# Altium schematic symbol library mastermind.SCHLIB: 732 symbols (part 5 of 5)
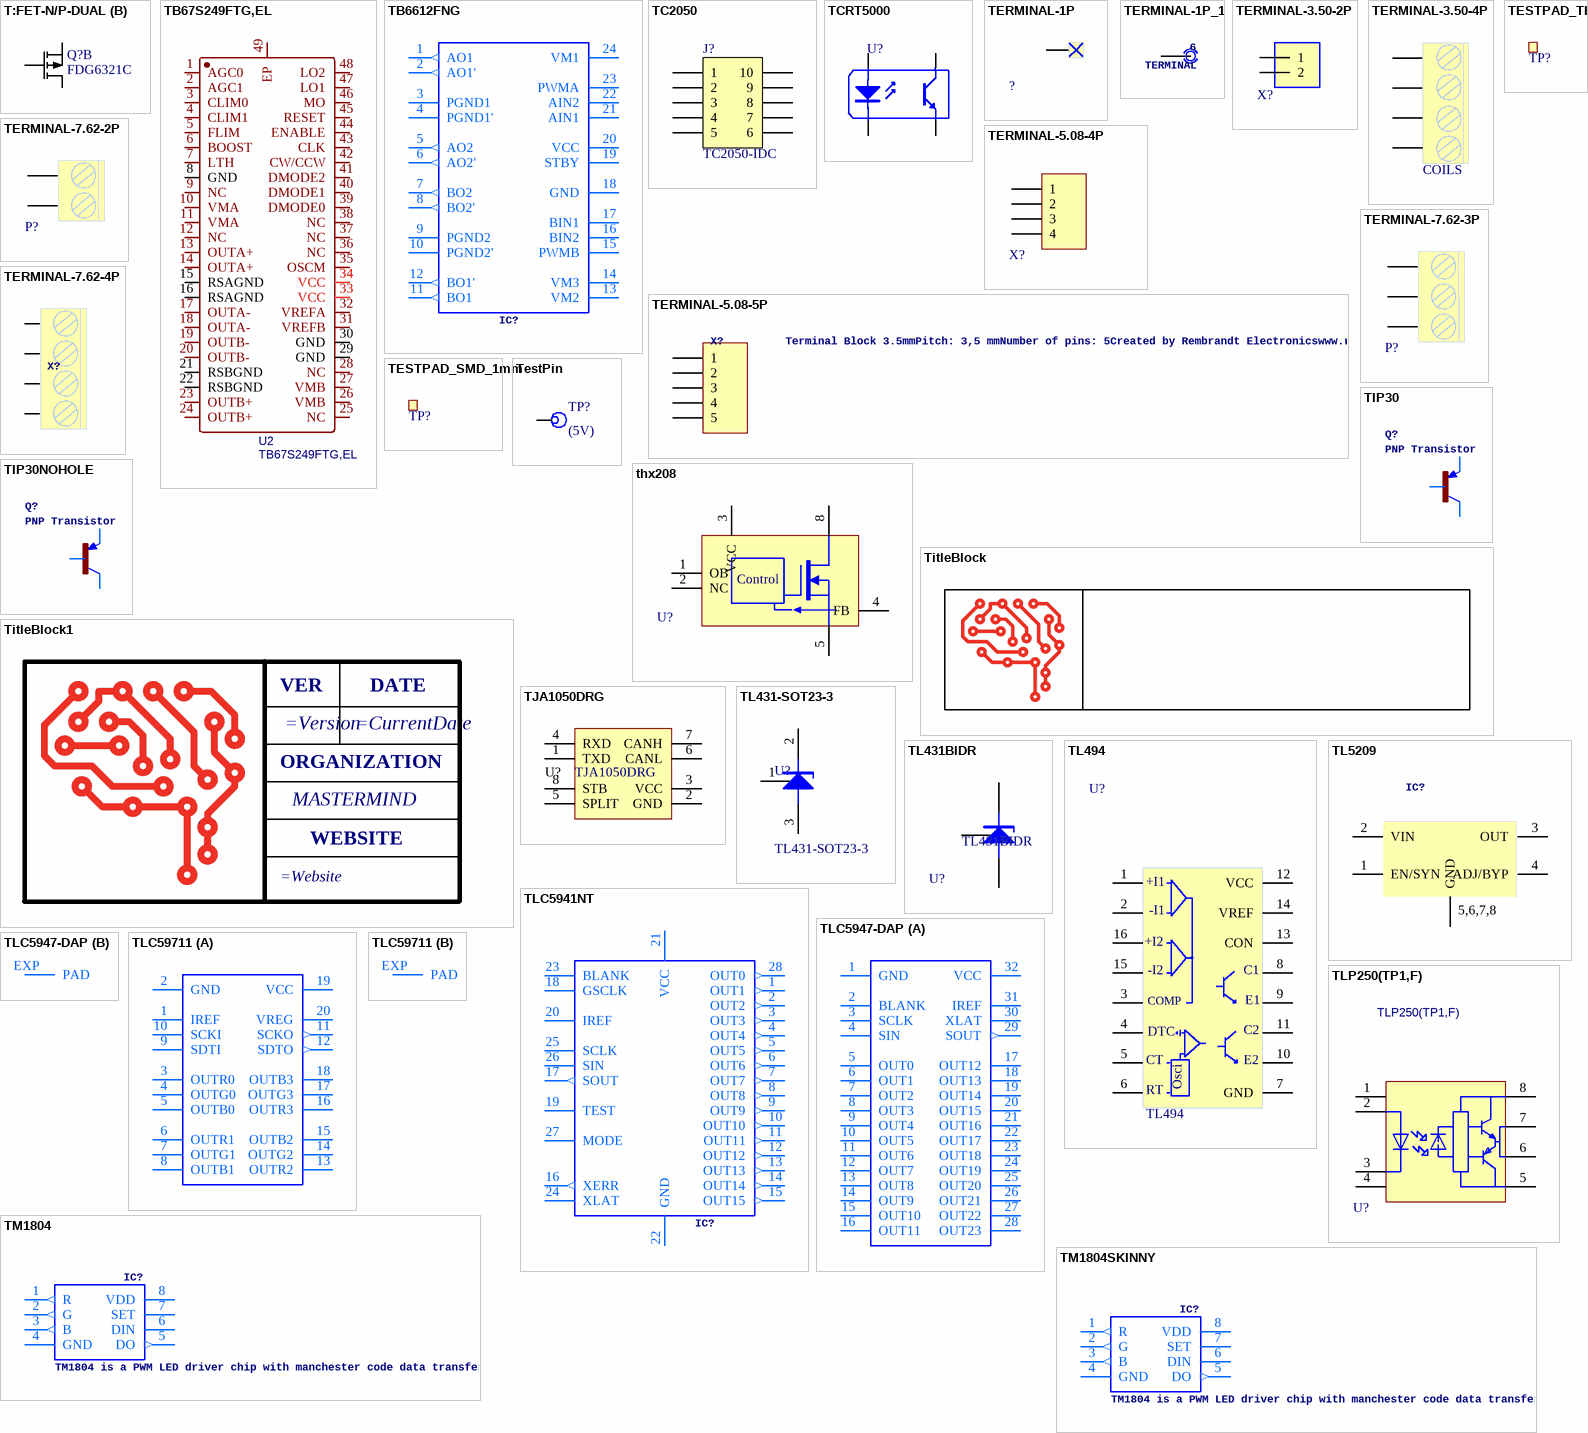
[diagram p38: symbols T:FET-N/P-DUAL to TM1804SKINNY]

## T:FET-N/P-DUAL
designator Q?, comment FDG6321C
Fairchild, FDG6321C, Dual N & P Channel Digital FET; Part Number: FDG6321C_IPC; 2nd source part number: FDG6321CCT-ND; Artikkelnr Noca: 35029089; Artikkelnr Simpro: N.A.; Manufacturer: Fairchild; Manufacturer Part Number: FDG6321C; Datasheet: http://www.fairchildsemi.com/ds/FD/FDG6321C.pdf; LatestRevisionDate: 2011-07-04; Pin Count: 6; Publisher: Nordic Semiconductor; Published: 2012-07-04; Value: FDG6321C; Note: Dual N & P Channel Digital FET; Supplier: Farnell; Supplier part number: 170-0689; 2nd source Supplier: Digi-Key; Footprint Doc: SC70-6
footprint SOT65P210X100-6N
part A pins: 1 S1, 2 G1, 6 D1
part B pins: 3 D2, 4 S2, 5 G2

## TB67S249FTG,EL
designator U2
BOM_Manufacturer: TOSHIBA(东芝); Contributor: LCSC; BOM_Supplier: LCSC; BOM_Supplier Part: C2150608; BOM_Manufacturer Part: TB67S249FTG,EL; BOM_JLCPCB Part Class: Extended Part; spicePre: U; spiceSymbolName: TB67S249FTG,EL
footprint QFN-48_L7.0-W7.0-P0.50-BL-EP5.4
pins: 1 AGC0, 2 AGC1, 3 CLIM0, 4 CLIM1, 5 FLIM, 6 BOOST, 7 LTH, 8 GND, 9 NC, 10 VMA, 11 VMA, 12 NC, 13 OUTA+, 14 OUTA+, 15 RSAGND, 16 RSAGND, 17 OUTA-, 18 OUTA-, 19 OUTB-, 20 OUTB-, 21 RSBGND, 22 RSBGND, 23 OUTB+, 24 OUTB+, 25 NC, 26 VMB, 27 VMB, 28 NC, 29 GND, 30 GND, 31 VREFB, 32 VREFA, 33 VCC, 34 VCC, 35 OSCM, 36 NC, 37 NC, 38 NC, 39 DMODE0, 40 DMODE1, 41 DMODE2, 42 CW/CCW, 43 CLK, 44 ENABLE, 45 RESET, 46 MO, 47 LO1, 48 LO2, 49 EP

## TB6612FNG
designator IC?, comment TB6612FNG   MOS dual H-bridge motor driver, 1.2A current 3.2A peak 3 or 5v logic and 3-15v motor  (value not drawn)
footprint SSOP24
pins: 1 AO1 (out), 2 AO1' (out), 3 PGND1 (power), 4 PGND1' (power), 5 AO2 (out), 6 AO2' (out), 7 BO2 (out), 8 BO2' (out), 9 PGND2 (power), 10 PGND2' (power), 11 BO1 (out), 12 BO1' (out), 13 VM2 (power), 14 VM3 (power), 15 PWMB, 16 BIN2, 17 BIN1, 18 GND (power), 19 STBY, 20 VCC (power), 21 AIN1, 22 AIN2, 23 PWMA, 24 VM1 (power)

## TC2050
designator J?, comment TC2050-IDC  (no BOM)
CBL PLUG-OF-NAILS 10-PIN; Part Number: TC2050-IDC-NLFP; Manufacturer: Tag-Connect LLC; Artikkelnr Noca: N.A.; Manufacturer Part Number: TC2050-IDC-NLFP; Datasheet: http://www.tag-connect.com/Materials/TC2050-IDC%20Datasheet.pdf; LatestRevisionDate: 2012-11-21; Publisher: Nordic Semiconductor; Published: 2012-11-21; Value: TC2050-IDC; Supplier: Digi-Key; Supplier part number: TC2050-IDC-NL-ND; 2nd source Supplier: *; 2nd source part number: *; Pin Count: 10; Footprint Doc: TC2050-IDC-NLFP; Artikkelnr Simpro: N.A.
footprint TC2050-IDC-NLFP
pins: 1, 2, 3, 4, 5, 6, 7, 8, 9, 10

## TCRT5000
designator U?  (value not drawn)
IR Transiver Pair; Published: 24-Mar-1999; LatestRevisionDate: 04-Mar-2005; LatestRevisionNote: Sch pins 3 & 4 Swapped.; DatasheetVersion: Nov-2003; PackageReference: DIP-4; Publisher: Altium Limited
footprint OPTO_TCRT5000
pins: 1 A "Anode", 2 K "Cathode", 3 E "Emitter", 4 C "Collector"

## TERMINAL-1P
designator ?
footprint TERMINAL
pins: CON 1

## TERMINAL-1P_1
designator 6, comment TERMINAL
footprint PAD_1P
pins: 1

## TERMINAL-3.50-2P
designator X?, comment Terminal Block 3.5mmPitch: 3,5 mmNumber of pins: 2Created by Rembrandt Electronicswww.rembrandtelectronics.com  (value not drawn)
SymbolName_1: TERMINAL-BLOCK-PIN-3.5MM; GateName_1: -1
footprint TERMINAL-BLOCK-2-PIN-3.5MM-ROUND-PAD
pins: 1, 2

## TERMINAL-3.50-4P
designator COILS, comment Terminal Block 3.5mmPitch: 3,5 mmNumber of pins: 2Created by Rembrandt Electronicswww.rembrandtelectronics.com  (value not drawn)
SymbolName_1: TERMINAL-BLOCK-PIN-3.5MM; GateName_1: -1
footprint TERMINAL-BLOCK-4-PIN-3.5MM-ROUND-PAD
pins: 1 K, 2 A, 3 K, 4 A

## TERMINAL-5.08-4P
designator X?
GateName_1: -1; SymbolName_1: TERMINAL-BLOCK-PIN-3.5MM
footprint TERMINAL-BLOCK-4-PIN-5MM-ROUND-PAD
pins: 1, 2, 3, 4

## TERMINAL-5.08-5P
designator X?, comment Terminal Block 3.5mmPitch: 3,5 mmNumber of pins: 5Created by Rembrandt Electronicswww.rembrandtelectronics.com
GateName_1: -1; SymbolName_1: TERMINAL-BLOCK-PIN-3.5MM
footprint TERMINAL-BLOCK-5-PIN-3.5MM-ROUND-PAD - duplicate
pins: 1, 2, 3, 4, 5

## TERMINAL-7.62-2P
designator P?, comment Terminal Block 3.5mmPitch: 3,5 mmNumber of pins: 2Created by Rembrandt Electronicswww.rembrandtelectronics.com  (value not drawn)
GateName_1: -1; SymbolName_1: TERMINAL-BLOCK-PIN-3.5MM
footprint CONN-TH_KF7.62-2P
footprint CONN-TH_KF9.50-2P
pins: 1 K, 2 A

## TERMINAL-7.62-3P
designator P?, comment Terminal Block 3.5mmPitch: 3,5 mmNumber of pins: 2Created by Rembrandt Electronicswww.rembrandtelectronics.com  (value not drawn)
GateName_1: -1; SymbolName_1: TERMINAL-BLOCK-PIN-3.5MM
footprint CONN-TH_KF7.62-3P
pins: 1 K, 2 A, 3 A

## TERMINAL-7.62-4P
designator X?, comment Terminal Block 3.5mmPitch: 3,5 mmNumber of pins: 2Created by Rembrandt Electronicswww.rembrandtelectronics.com  (value not drawn)
GateName_1: -1; SymbolName_1: TERMINAL-BLOCK-PIN-3.5MM
footprint TERMINAL-BLOCK-4-PIN-7.6MM-LONG-PAD
pins: 1 K, 2 A, 3 A, 4 A

## TESTPAD_SMD_1mm
designator TP?, comment Ø1.0mm,SMD  (value not drawn)  (no BOM)
Part Number: TP_SMD_Ø1.0MM; Manufacturer: Nordic Semiconductor; Artikkelnr Noca: N.A.; Manufacturer Part Number: *; Datasheet: *; LatestRevisionDate: 2013-06-11; Pin Count: 1; Publisher: Nordic Semiconductor; Published: 2013-06-11; Value: Ø1.0mm,SMD; Note: *; Supplier: *; Supplier part number: *; 2nd source Supplier: *; 2nd source part number: *; Footprint Doc: TP_SMD_Ø1.0mm; Artikkelnr Simpro: N.A.
footprint Test Pin 1.3mm
pins: 1

## TESTPAD_TH
designator TP?, comment TP  (value not drawn)  (no BOM)
Testpoint, through hole; Part Number: Testpoint TH; Artikkelnr Noca: N.A.; Manufacturer: *; Manufacturer Part Number: *; Datasheet: *; Footprint Doc: TESTPAD-TH; LatestRevisionDate: 2009-12-12; Pin Count: 1; Publisher: Nordic Semiconductor; Published: 2009-12-12; Value: TP; Note: *; Supplier: *; Supplier part number: *; 2nd source Supplier: *; 2nd source part number: *; Artikkelnr Simpro: N.A.
footprint TESTPAD-TH
pins: 1

## TestPin
designator TP?, comment (5V)  (no BOM)
footprint Test Pin
footprint Test Pin Hole
pins: 1 TP

## thx208
designator U?
footprint SOIC-8E_thx208 (SOIC, 8-Leads, Body 4.90x3.90mm, Pitch 1.27mm, IPC Medium Density)
pins: 1 OB (power), 2 NC, 3 VCC, 4 FB (power), 5 GND, 8 OC
text: Control

## TIP30
designator Q?, comment PNP Transistor
footprint TO220
pins: 1 B, 2 C, 3 E

## TIP30NOHOLE
designator Q?, comment PNP Transistor
footprint TO220-NOHOLE
pins: 1 B, 2 C, 3 E

## TitleBlock
designator *  (value not drawn)
Title Block for Schematic Sheets

## TitleBlock1
designator *  (value not drawn)  (graphical)
Title Block for Schematic Sheets
text: VER; DATE; ORGANIZATION; MASTERMIND; WEBSITE

## TJA1050DRG
designator U?
CAN Transceiver; Manufacturer: HGC(深圳汉芯); Add into BOM: yes; Symbol: TJA1050DRG; Device: TJA1050DRG; LCSC Part Name: TJA1050DRG; Supplier Part: C19723770; Manufacturer Part: TJA1050DRG; Supplier Footprint: SOP-8; JLCPCB Part Class: Extended Part; Datasheet: https://atta.szlcsc.com/upload/public/pdf/source/20231229/9EC40A6172CAB0350BF7AF3421F4DEBF.pdf; Supplier: LCSC; Convert to PCB: yes
footprint SOIC-8E (SOIC, 8-Leads, Body 4.90x3.90mm, Pitch 1.27mm, IPC Medium Density)
footprint SOIC-8_L4.9-W3.9-P1.27-LS6.0-BL
pins: 1 TXD, 2 GND, 3 VCC, 4 RXD, 5 SPLIT, 6 CANL, 7 CANH, 8 STB

## TL431-SOT23-3
designator U?
Shunt Voltage Regulator
footprint SOT23
pins: 1 Ref "REFERENCE", 2 K "CATHODE", 3 A "ANODE"

## TL431BIDR
designator U?
TL431 Precision Programmable Reference; Manufacturer: TI(德州仪器); Add into BOM: yes; Output Type: Adjustable; Output Voltage: 2.495V~36V; Output Current: 100mA; Tolerance: ±0.5%; Reference Type: parallel connection; Minimum Cathode Current for Regulation: 700uA; Symbol: TL431BIDR; Device: TL431BIDR; LCSC Part Name: TL431BIDR; Supplier Part: C366884; Manufacturer Part: TL431BIDR; Supplier Footprint: SOIC-8; JLCPCB Part Class: Extended Part; Datasheet: https://www.ti.com/cn/lit/gpn/tl431; Supplier: LCSC; Convert to PCB: yes; Input Voltage: -; Temperature Coefficient: -; Supply Current: -; Noise - 1/10Hz to 10Hz: -; Noise - 10Hz to 10kHz: -; Operating Temperature: -40℃~+85℃@(Ta)
footprint SOIC-8E (SOIC, 8-Leads, Body 4.90x3.90mm, Pitch 1.27mm, IPC Medium Density); pin to pad 3>2+3+6+7
footprint SOIC-8_L4.9-W3.9-P1.27-LS6.0-BL
pins: 1 K "CATHODE", 3 A "ANODE", 4 NC hidden, 5 NC hidden, 8 Ref "REFERENCE"

## TL494
designator U?  (value not drawn)
TL494 IC
footprint SO-16
pins: 1 +IN1, 2 -IN1, 3 FB, 4 DTC, 5 CT, 6 RT, 7 GND, 8 C1, 9 E1, 10 E2, 11 C2, 12 VCC, 13 CON, 14 VREF, 15 -IN2, 16 +IN2
text: +I1; -I1; +I2; -I2; COMP; Osci

## TL5209
designator IC?
footprint SOIC-8E (SOIC, 8-Leads, Body 4.90x3.90mm, Pitch 1.27mm, IPC Medium Density)
pins: 1 EN/SYN, 2 VIN, 3 OUT, 4 ADJ/BYP, 5 GND, 6 GND, 7 GND (power), 8 GND (power)
text: 5,6,7,8

## TLC5941NT
designator IC?
footprint DIL28-3
pins: 1 OUT1 (out), 2 OUT2 (out), 3 OUT3 (out), 4 OUT4 (out), 5 OUT5 (out), 6 OUT6 (out), 7 OUT7 (out), 8 OUT8 (out), 9 OUT9 (out), 10 OUT10 (out), 11 OUT11 (out), 12 OUT12 (out), 13 OUT13 (out), 14 OUT14 (out), 15 OUT15 (out), 16 XERR (out), 17 SOUT (out), 18 GSCLK, 19 TEST, 20 IREF, 21 VCC (power), 22 GND (power), 23 BLANK, 24 XLAT, 25 SCLK, 26 SIN, 27 MODE, 28 OUT0 (out)

## TLC5947-DAP
designator IC?
footprint HTSSOP32DAP
part A pins: 1 GND (power), 2 BLANK, 3 SCLK, 4 SIN, 5 OUT0 (oc), 6 OUT1 (oc), 7 OUT2 (oc), 8 OUT3 (oc), 9 OUT4 (oc), 10 OUT5 (oc), 11 OUT6 (oc), 12 OUT7 (oc), 13 OUT8 (oc), 14 OUT9 (oc), 15 OUT10 (oc), 16 OUT11 (oc), 17 OUT12 (oc), 18 OUT13 (oc), 19 OUT14 (oc), 20 OUT15 (oc), 21 OUT16 (oc), 22 OUT17 (oc), 23 OUT18 (oc), 24 OUT19 (oc), 25 OUT20 (oc), 26 OUT21 (oc), 27 OUT22 (oc), 28 OUT23 (oc), 29 SOUT (out), 30 XLAT, 31 IREF, 32 VCC (power)
part B pins: EXP PAD

## TLC59711
designator IC?
footprint HTSSOP20DAP
part A pins: 1 IREF, 2 GND (power), 3 OUTR0 (oc), 4 OUTG0 (oc), 5 OUTB0 (oc), 6 OUTR1 (oc), 7 OUTG1 (oc), 8 OUTB1 (oc), 9 SDTI, 10 SCKI, 11 SCKO (out), 12 SDTO (out), 13 OUTR2 (oc), 14 OUTG2 (oc), 15 OUTB2 (oc), 16 OUTR3 (oc), 17 OUTG3 (oc), 18 OUTB3 (oc), 19 VCC (power), 20 VREG
part B pins: EXP PAD

## TLP250(TP1,F)
designator U?
Opto Gate Driver; Manufacturer: TOSHIBA; Supplier: LCSC; Manufacturer Part: TLP250(TP1,F); Supplier Part: C41664; spicePre: U; spiceSymbolName: TLP250(TP1,F)
footprint DIL08-ROUND
pins: 1, 2, 3, 4, 5 GND, 6, 7, 8 VCC

## TM1804
designator IC?, comment TM1804 is a PWM LED driver chip with manchester code data transfer!
footprint SO08
pins: 1 R (out), 2 G (out), 3 B (out), 4 GND (power), 5 DO (out), 6 DIN, 7 SET, 8 VDD (power)

## TM1804SKINNY
designator IC?, comment TM1804 is a PWM LED driver chip with manchester code data transfer!
footprint SO08-SKINNYPADS
pins: 1 R (out), 2 G (out), 3 B (out), 4 GND (power), 5 DO (out), 6 DIN, 7 SET, 8 VDD (power)

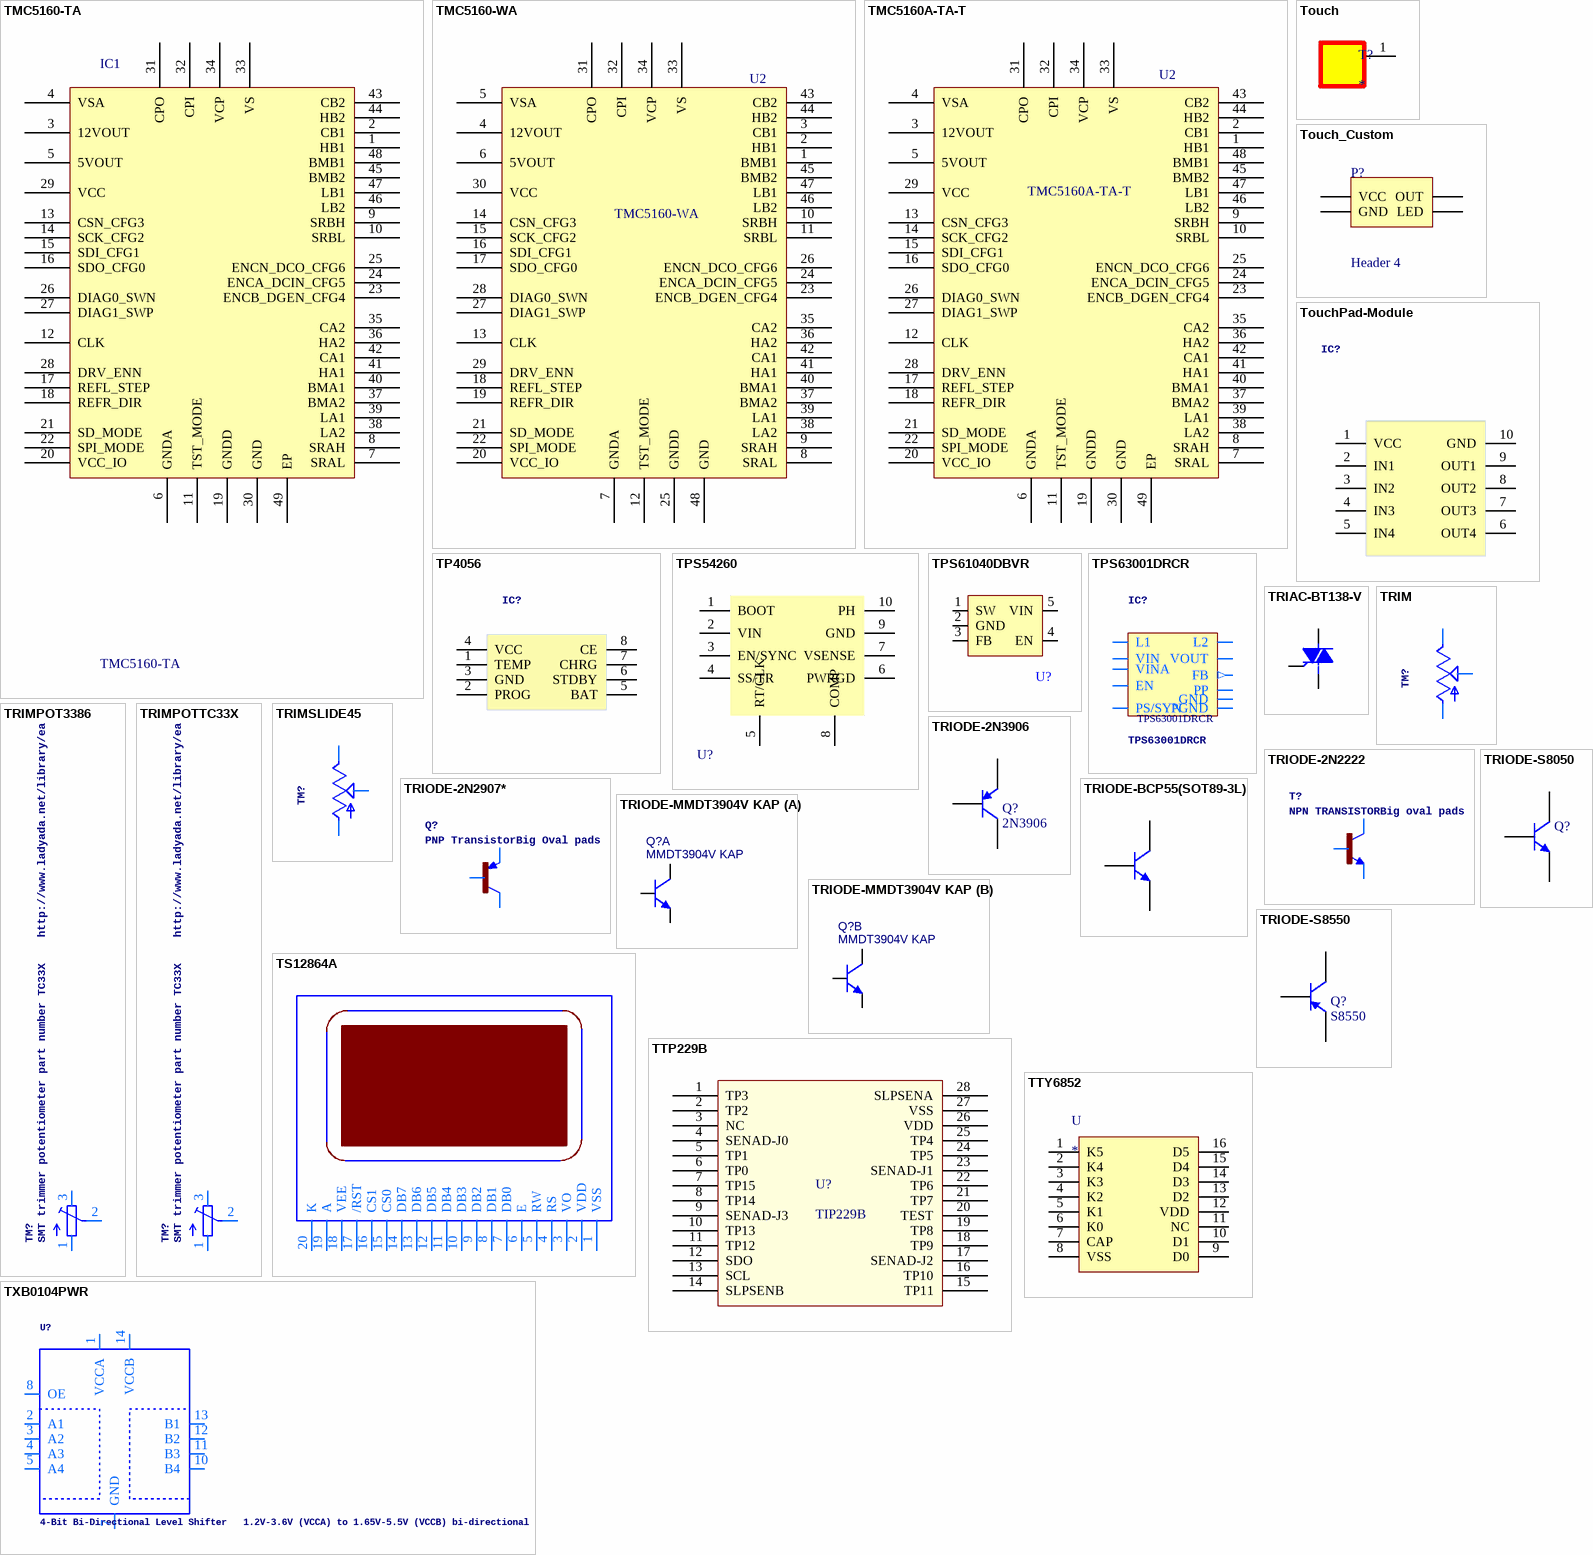
[diagram p30: symbols TMC5160-TA to TXB0104PWR]

## TMC5160-TA
designator IC1
Manufacturer: TRINAMIC; Geometry.Height: 1,2mm; Distributor#1: Digikey; Distributor#2: *; MPN: TMC5160-TA; MF: TRINAMIC
footprint TMC5160_TSQFP50P900X900X120_HS-49L (TSQFP, 48-Leads, Body 7,00x7,00mm, Pitch 0,50mm, Thermal Pad 5,10x5,10mm, IPC High Density)
pins: 1 HB1, 2 CB1, 3 12VOUT, 4 VSA, 5 5VOUT, 6 GNDA, 7 SRAL, 8 SRAH, 9 SRBH, 10 SRBL, 11 TST_MODE, 12 CLK, 13 CSN_CFG3, 14 SCK_CFG2, 15 SDI_CFG1, 16 SDO_CFG0, 17 REFL_STEP, 18 REFR_DIR, 19 GNDD, 20 VCC_IO, 21 SD_MODE, 22 SPI_MODE, 23 ENCB_DGEN_CFG4, 24 ENCA_DCIN_CFG5, 25 ENCN_DCO_CFG6, 26 DIAG0_SWN, 27 DIAG1_SWP, 28 DRV_ENN, 29 VCC, 30 GND, 31 CPO, 32 CPI, 33 VS, 34 VCP, 35 CA2, 36 HA2, 37 BMA2, 38 LA2, 39 LA1, 40 BMA1, 41 HA1, 42 CA1, 43 CB2, 44 HB2, 45 BMB2, 46 LB2, 47 LB1, 48 BMB1, 49 EP

## TMC5160-WA
designator U2
Designaor: *
footprint QFN-56_L8.0-W8.0-P0.50-BL-EP6.3-TMC5160
pins: 1 BMB1, 2 HB1, 3 CB1, 4 12VOUT, 5 VSA, 6 5VOUT, 7 GNDA, 8 SRAL, 9 SRAH, 10 SRBH, 11 SRBL, 12 TST_MODE, 13 CLK, 14 CSN_CFG3, 15 SCK_CFG2, 16 SDI_CFG1, 17 SDO_CFG0, 18 REFL_STEP, 19 REFR_DIR, 20 VCC_IO, 21 SD_MODE, 22 SPI_MODE, 23 ENCB_DGEN_CFG4, 24 ENCA_DCIN_CFG5, 25 GNDD, 26 ENCN_DCO_CFG6, 27 DIAG1_SWP, 28 DIAG0_SWN, 29 DRV_ENN, 30 VCC, 31 CPO, 32 CPI, 33 VS, 34 VCP, 35 CA2, 36 HA2, 37 BMA2, 38 LA2, 39 LA1, 40 BMA1, 41 HA1, 42 CA1, 43 CB2, 44 HB2, 45 BMB2, 46 LB2, 47 LB1, 48 GND

## TMC5160A-TA-T
designator U2
BOM_Manufacturer: TRINAMIC Motion Control GmbH; Contributor: LCSC; BOM_Supplier: LCSC; BOM_Supplier Part: C516354; BOM_Manufacturer Part: TMC5160A-TA-T; BOM_JLCPCB Part Class: Extended Part; spicePre: U; spiceSymbolName: TMC5160A-TA-T
footprint TQFP-48_L7.0-W7.0-P0.50-LS9.0-BL-EP
pins: 1 HB1, 2 CB1, 3 12VOUT, 4 VSA, 5 5VOUT, 6 GNDA, 7 SRAL, 8 SRAH, 9 SRBH, 10 SRBL, 11 TST_MODE, 12 CLK, 13 CSN_CFG3, 14 SCK_CFG2, 15 SDI_CFG1, 16 SDO_CFG0, 17 REFL_STEP, 18 REFR_DIR, 19 GNDD, 20 VCC_IO, 21 SD_MODE, 22 SPI_MODE, 23 ENCB_DGEN_CFG4, 24 ENCA_DCIN_CFG5, 25 ENCN_DCO_CFG6, 26 DIAG0_SWN, 27 DIAG1_SWP, 28 DRV_ENN, 29 VCC, 30 GND, 31 CPO, 32 CPI, 33 VS, 34 VCP, 35 CA2, 36 HA2, 37 BMA2, 38 LA2, 39 LA1, 40 BMA1, 41 HA1, 42 CA1, 43 CB2, 44 HB2, 45 BMB2, 46 LB2, 47 LB1, 48 BMB1, 49 EP

## Touch
designator T?
footprint Touch
footprint TouchSquare_15mm
footprint Touch - SPRING
footprint TouchSquare_12mm
footprint Touch - Circle
pins: 1 T

## Touch_Custom
designator P?, comment Header 4
Header, 4-Pin; LatestRevisionDate: 17-Jul-2002; LatestRevisionNote: Re-released for DXP Platform.; Publisher: Altium Limited
footprint TOUCH_Custom
pins: 1 GND, 2 OUT, 3 VCC, 4 LED

## TouchPad-Module
designator IC?, comment TIMERChanged DIP package to have round (not oval) pin pads    http://www.ladyada.net/library/pcb/eaglelibrary.html  (value not drawn)
footprint TOUCHMODULE
pins: 1 VCC, 2 IN1, 3 IN2, 4 IN3, 5 IN4, 6 OUT4, 7 OUT3, 8 OUT2, 9 OUT1, 10 GND

## TP4056
designator IC?
footprint SOIC-8E (SOIC, 8-Leads, Body 4.90x3.90mm, Pitch 1.27mm, IPC Medium Density)
pins: 1 TEMP (power), 2 PROG, 3 GND, 4 VCC (power), 5 BAT, 6 STDBY, 7 CHRG, 8 CE

## TPS54260
designator U?
footprint HVSSOP10
pins: 1 BOOT, 2 VIN, 3 EN/SYNC, 4 SS/TR, 5 RT/CLK, 6 PWRGD, 7 VSENSE (power), 8 COMP, 9 GND (power), 10 PH

## TPS61040DBVR
designator U?  (value not drawn)
Boost type 28V 1.8V~6V 350mA SOT-23-5 DC-DC Converters ROHS; Manufacturer: TI(德州仪器); Add into BOM: yes; Function: boost converterType; Switching Frequency: 1MHz; Synchronous Rectification: NO; Number of Outputs: 1; Switch tube (built-in/external): 内置; Symbol: TPS61040DBVR; Device: TPS61040DBVR; LCSC Part Name: TPS61040DBVR; Supplier Part: C7722; Manufacturer Part: TPS61040DBVR; Supplier Footprint: SOT-23-5; JLCPCB Part Class: Extended Part; Datasheet: https://www.ti.com/cn/lit/gpn/tps61040; Supplier: LCSC; Convert to PCB: yes; Input Voltage: 1.8V~6V; Output Voltage: 28V; Output Current (Max): 350mA; Topology: Boost
3D model SOT-23-5_L2.9-W1.6-H1.1-LS2.8-P0.95
footprint SOT23-5L
pins: 1 SW, 2 GND, 3 FB, 4 EN, 5 VIN

## TPS63001DRCR
designator IC?
footprint TPS63001DRCR
pins: 1 VOUT, 2 L2, 3 PGND, 4 L1, 5 VIN, 6 EN, 7 PS/SYN, 8 VINA, 9 GND, 10 FB (out), 11 PP

## TRIAC-BT138-V
designator BT1, comment TRIAC   Source: http://www.semiconductors.philips.com BT138_SERIES_2.pdf  (value not drawn)
footprint TO220DS
pins: G, T1 A1, T2 A2

## TRIM
designator TM?
footprint 6MM
pins: A, E, S

## TRIMPOT3386
designator TM?, comment SMT trimmer potentiometer part number TC33X    http://www.ladyada.net/library/eagle
footprint TRIM-3386
pins: 1 A, 2 S, 3 E

## TRIMPOTTC33X
designator TM?, comment SMT trimmer potentiometer part number TC33X    http://www.ladyada.net/library/eagle
footprint TC33X
pins: 1 A, 2 S, 3 E

## TRIMSLIDE45
designator TM?
footprint SLIDEPOT-45
pins: A, B S, C E

## TRIODE-2N2222
designator T?, comment NPN TRANSISTORBig oval pads
footprint TO92-EBC-OVAL
pins: 1 E, 2 B, 3 C

## TRIODE-2N2907*
designator Q?, comment PNP TransistorBig Oval pads
footprint TO92-EBC-OVAL
pins: 1 E, 2 B, 3 C

## TRIODE-2N3906
designator Q?, comment 2N3906
PNP General Purpose Amplifier; Published: 8-Jun-2000; LatestRevisionDate: 15-Jan-2003; LatestRevisionNote: PCB Footprint 'BCY-W3/D4.7' replaced; DatasheetVersion: 1997; PackageVersion: Sep-1998; PackageReference: TO-92A; Publisher: Altium Limited; PackageDescription: TO, Flat Index; 3 In-Line, Axial Leads; Body Dia. 4.5mm; Leads 0.51 x 0.48 mm (max); ComponentLink1Description: Manufacturer Link; ComponentLink1URL: http://www.fairchildsemi.com/; ComponentLink2Description: Datasheet; ComponentLink2URL: http://www.fairchildsemi.com/ds/2N%2F2N3906.pdf
simulation model 2N3906 (PNP)
signal-integrity model 2N3906
footprint SOT23
pins: 1 B, 2 E, 3 C

## TRIODE-BCP55(SOT89-3L)
designator T?, comment BCP55(SOT89-3L)  (value not drawn)
60V 1.5A Transistor; Manufacturer: HXY MOSFET(华轩阳电子); Add into BOM: yes; DC Current Gain (hFE@Ic,Vce): 250@150mA,2V; Transition Frequency (fT): 100MHz; Collector Cut-Off Current (Icbo): 100nA; Collector-Emitter Saturation Voltage (VCE(sat)@Ic,Ib): 500mV@500mA,50mA; Symbol: BCP55(SOT89-3L); Device: BCP55(SOT89-3L); LCSC Part Name: 耐压:60V 电流:1A NPN; Supplier Part: C5346132; Manufacturer Part: BCP55(SOT89-3L); Supplier Footprint: SOT-89-3L; JLCPCB Part Class: Extended Part; Datasheet: https://atta.szlcsc.com/upload/public/pdf/source/20230112/7861CB78B5C82510FD37DBAFC3054306.pdf; Supplier: LCSC; Convert to PCB: yes; Operating Temperature: -55℃~+150℃
footprint SOT89-3
pins: 1 B, 2 C, 3 E

## TRIODE-MMDT3904V KAP
designator Q?, comment MMDT3904V KAP
2 NPN SOT-563 Bipolar Transistors; Manufacturer: CBI(创基); Contributor: LCSC; Supplier: LCSC; Supplier Part: C2919809; Manufacturer Part: MMDT3904V KAP; JLCPCB Part Class: Extended Part; spicePre: Q; spiceSymbolName: MMDT3904V KAP
footprint SOT-563_L1.6-W1.2-P0.50-LS1.6-BR
part A pins: 1 E, 2 B, 6 C
part B pins: 3 C, 4 E, 5 B

## TRIODE-S8050
designator Q?
NPN Bipolar Transistor; Published: 8-Jun-2000; LatestRevisionDate: 17-Jul-2002; LatestRevisionNote: Re-released for DXP Platform.; PackageReference: TO-226-AA; Publisher: Altium Limited; PackageDescription: TO, Flat Index; 3 In-Line, Axial Leads; Body Dia. 4.8mm; Leads 0.55 x 0.51 mm (max); Code_JEDEC: TO-226-AA
simulation model NPN
signal-integrity model NPN
footprint SOT23
pins: 1 B, 2 E, 3 C

## TRIODE-S8550
designator Q?, comment S8550
PNP Bipolar Transistor; Published: 8-Jun-2000; LatestRevisionDate: 15-Jan-2003; LatestRevisionNote: PCB Footprint 'BCY-W3/D4.7' replaced; DatasheetVersion: 1997; PackageVersion: Sep-1998; PackageReference: TO-92A; Publisher: Altium Limited; PackageDescription: TO, Flat Index; 3 In-Line, Axial Leads; Body Dia. 4.5mm; Leads 0.51 x 0.48 mm (max); ComponentLink1Description: Manufacturer Link; ComponentLink1URL: http://www.fairchildsemi.com/; ComponentLink2Description: Datasheet; ComponentLink2URL: http://www.fairchildsemi.com/ds/2N%2F2N3906.pdf
simulation model 2N3906 (PNP)
signal-integrity model 2N3906
footprint SOT23
pins: 1 B, 2 E, 3 C

## TS12864A
designator ?, comment KS0108 based display. Some have slightly different pinouts so double check!  (value not drawn)
footprint TS12864
pins: 1 VSS (oe), 2 VDD (oe), 3 VO, 4 RS, 5 RW, 6 E, 7 DB0, 8 DB1, 9 DB2, 10 DB3, 11 DB4, 12 DB5, 13 DB6, 14 DB7, 15 CS0, 16 CS1, 17 /RST, 18 VEE (oe), 19 A (oe), 20 K

## TTP229B
designator U?, comment TIP229B
TIP229B_28_ic
footprint ttp229
pins: 1 TP3, 2 TP2, 3 NC, 4 SENAD-J0, 5 TP1, 6 TP0, 7 TP15, 8 TP14, 9 SENAD-J3, 10 TP13, 11 TP12, 12 SDO, 13 SCL, 14 SLPSENB, 15 TP11, 16 TP10, 17 SENAD-J2, 18 TP9, 19 TP8, 20 TEST, 21 TP7, 22 TP6, 23 SENAD-J1, 24 TP5, 25 TP4, 26 VDD, 27 VSS, 28 SLPSENA

## TTY6852
designator U
SOP-16_L10.0-W3.9-P1.27-LS6.0-BL; MF: Vishay Semiconductor; MP: TCMT4606; Digi-Key_Part_Number: TCMT4606CT-ND; DigiKey-Purchase-URL: https://snapeda.com/shop?store=DigiKey&id=649284; Package: SOP-16 Vishay; Value: *; SnapEDA_Link: https://www.snapeda.com/parts/TCMT4606/Vishay%20Semiconductor%20Opto%20Division/view-part/649284/?ref=snap
footprint SO-16
pins: 1 K5, 2 K4, 3 K3, 4 K2, 5 K1, 6 K0, 7 CAP, 8 VSS, 9 D0, 10 D1, 11 NC, 12 VDD, 13 D2, 14 D3, 15 D4, 16 D5

## TXB0104PWR
designator U?, comment 4-Bit Bi-Directional Level Shifter   1.2V-3.6V (VCCA) to 1.65V-5.5V (VCCB) bi-directional level shifter with auto direction sensing.    Max data rate - VCCA 1.8V:  20Mbps (50ns), VCCA 3.3V: 100Mbps (10ns)       Digikey: 296-21929-1-ND
footprint TSSOP14
pins: 1 VCCA, 2 A1, 3 A2, 4 A3, 5 A4, 7 GND, 8 OE, 10 B4, 11 B3, 12 B2, 13 B1, 14 VCCB

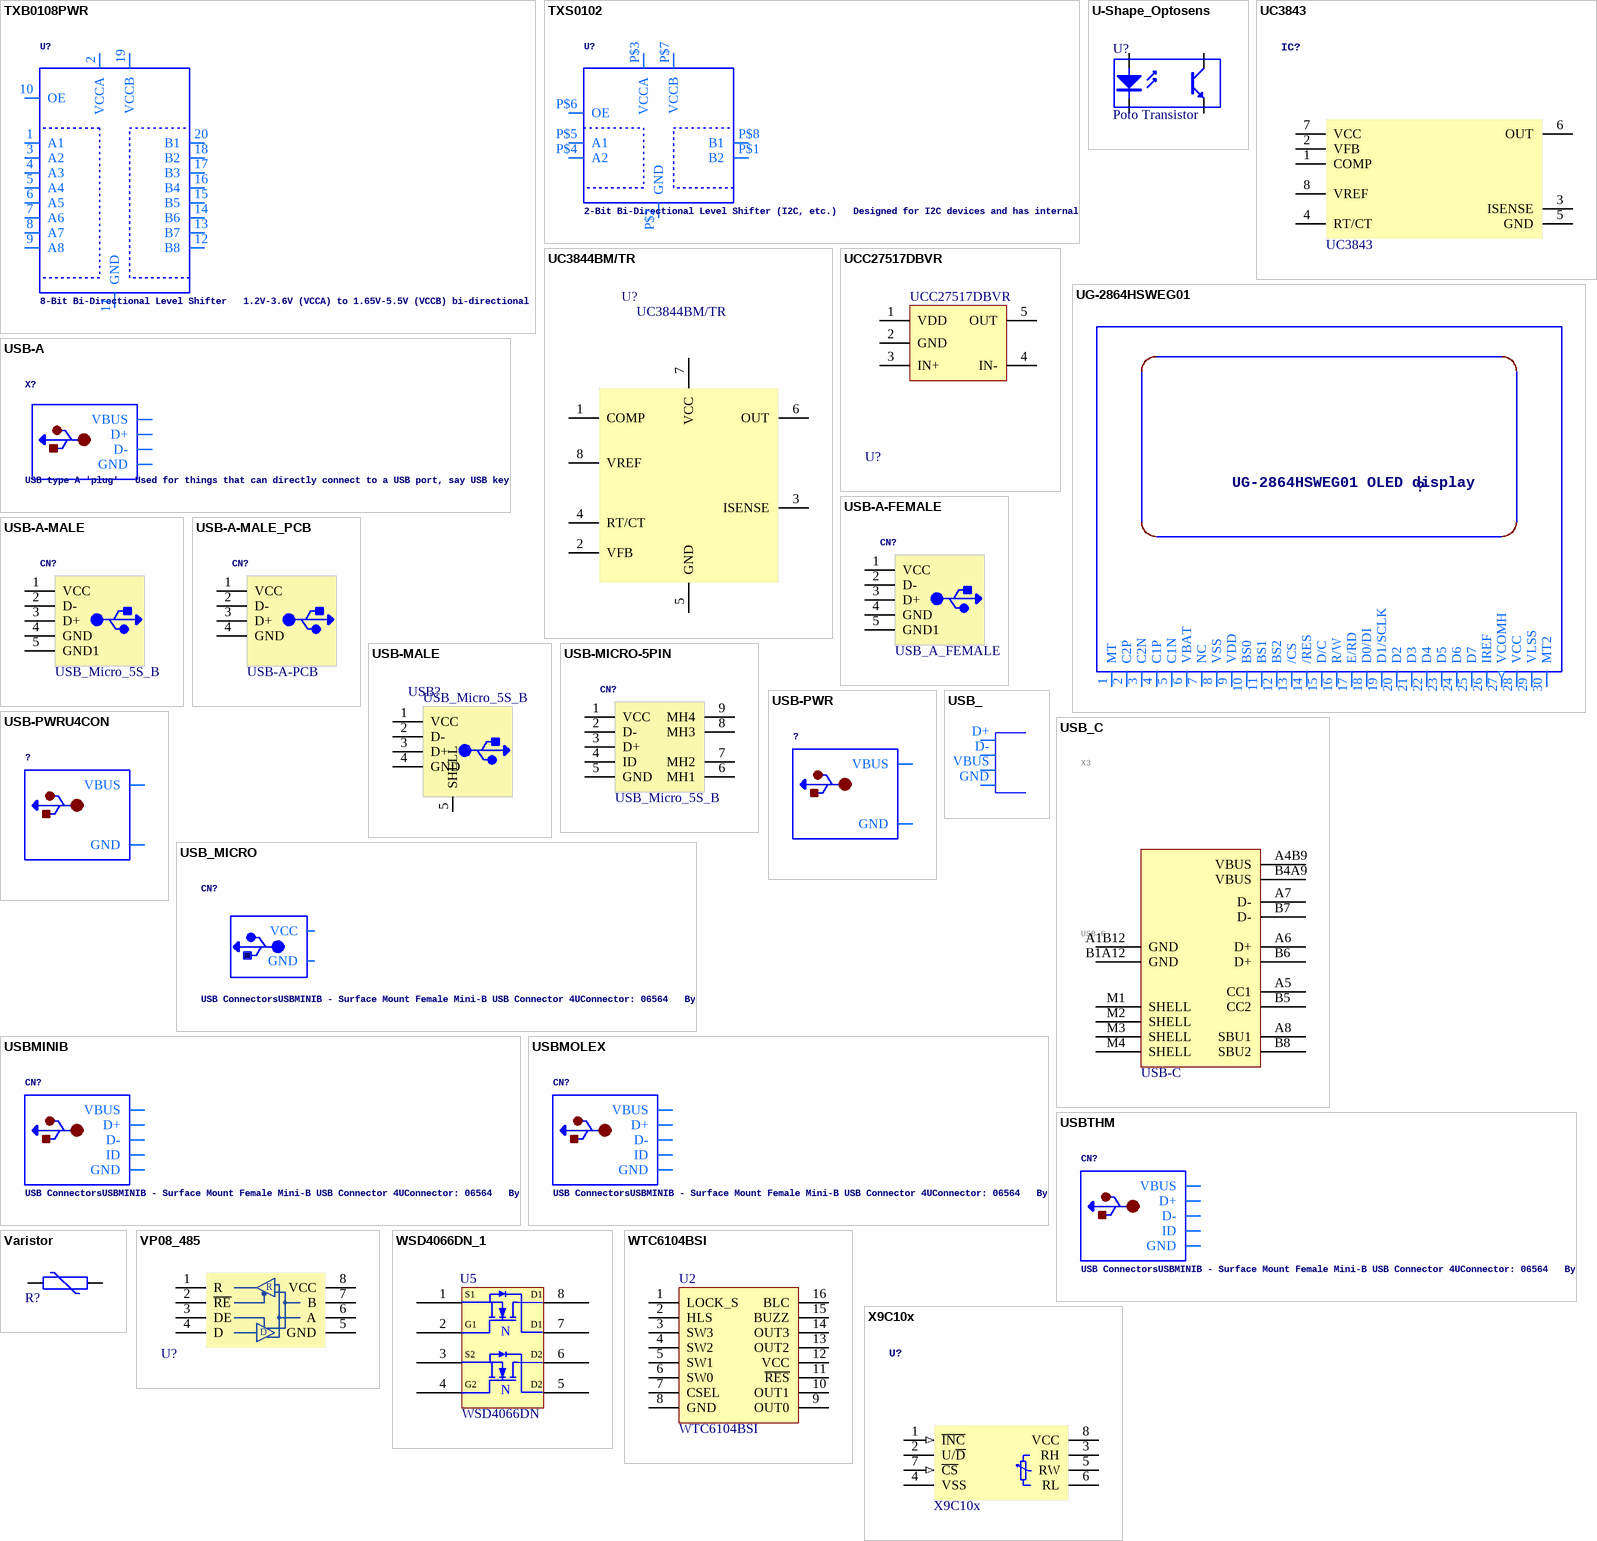
[diagram p31: symbols TXB0108PWR to X9C10x]

## TXB0108PWR
designator U?, comment 8-Bit Bi-Directional Level Shifter   1.2V-3.6V (VCCA) to 1.65V-5.5V (VCCB) bi-directional level shifter with auto direction sensing.    Max data rate - VCCA 1.8V:  20Mbps (50ns), VCCA 3.3V: 100Mbps (10ns)       Digikey: 296-21527-1-ND
footprint TSSOP20
pins: 1 A1, 2 VCCA, 3 A2, 4 A3, 5 A4, 6 A5, 7 A6, 8 A7, 9 A8, 10 OE, 11 GND, 12 B8, 13 B7, 14 B6, 15 B5, 16 B4, 17 B3, 18 B2, 19 VCCB, 20 B1